# Altium footprint library 我的元件库01.PcbLib: 321 footprints (part 8 of 21)
Each footprint in its own frame and in the unit in brackets; x right, y up, seen from the top. Pads: shape width x height; smd on the part's side, far side on the other; paste and mask are expansions set on the pad; w line width, h text height; cw(c..) or ccw(c..) is an arc to the next point about the centre after c.
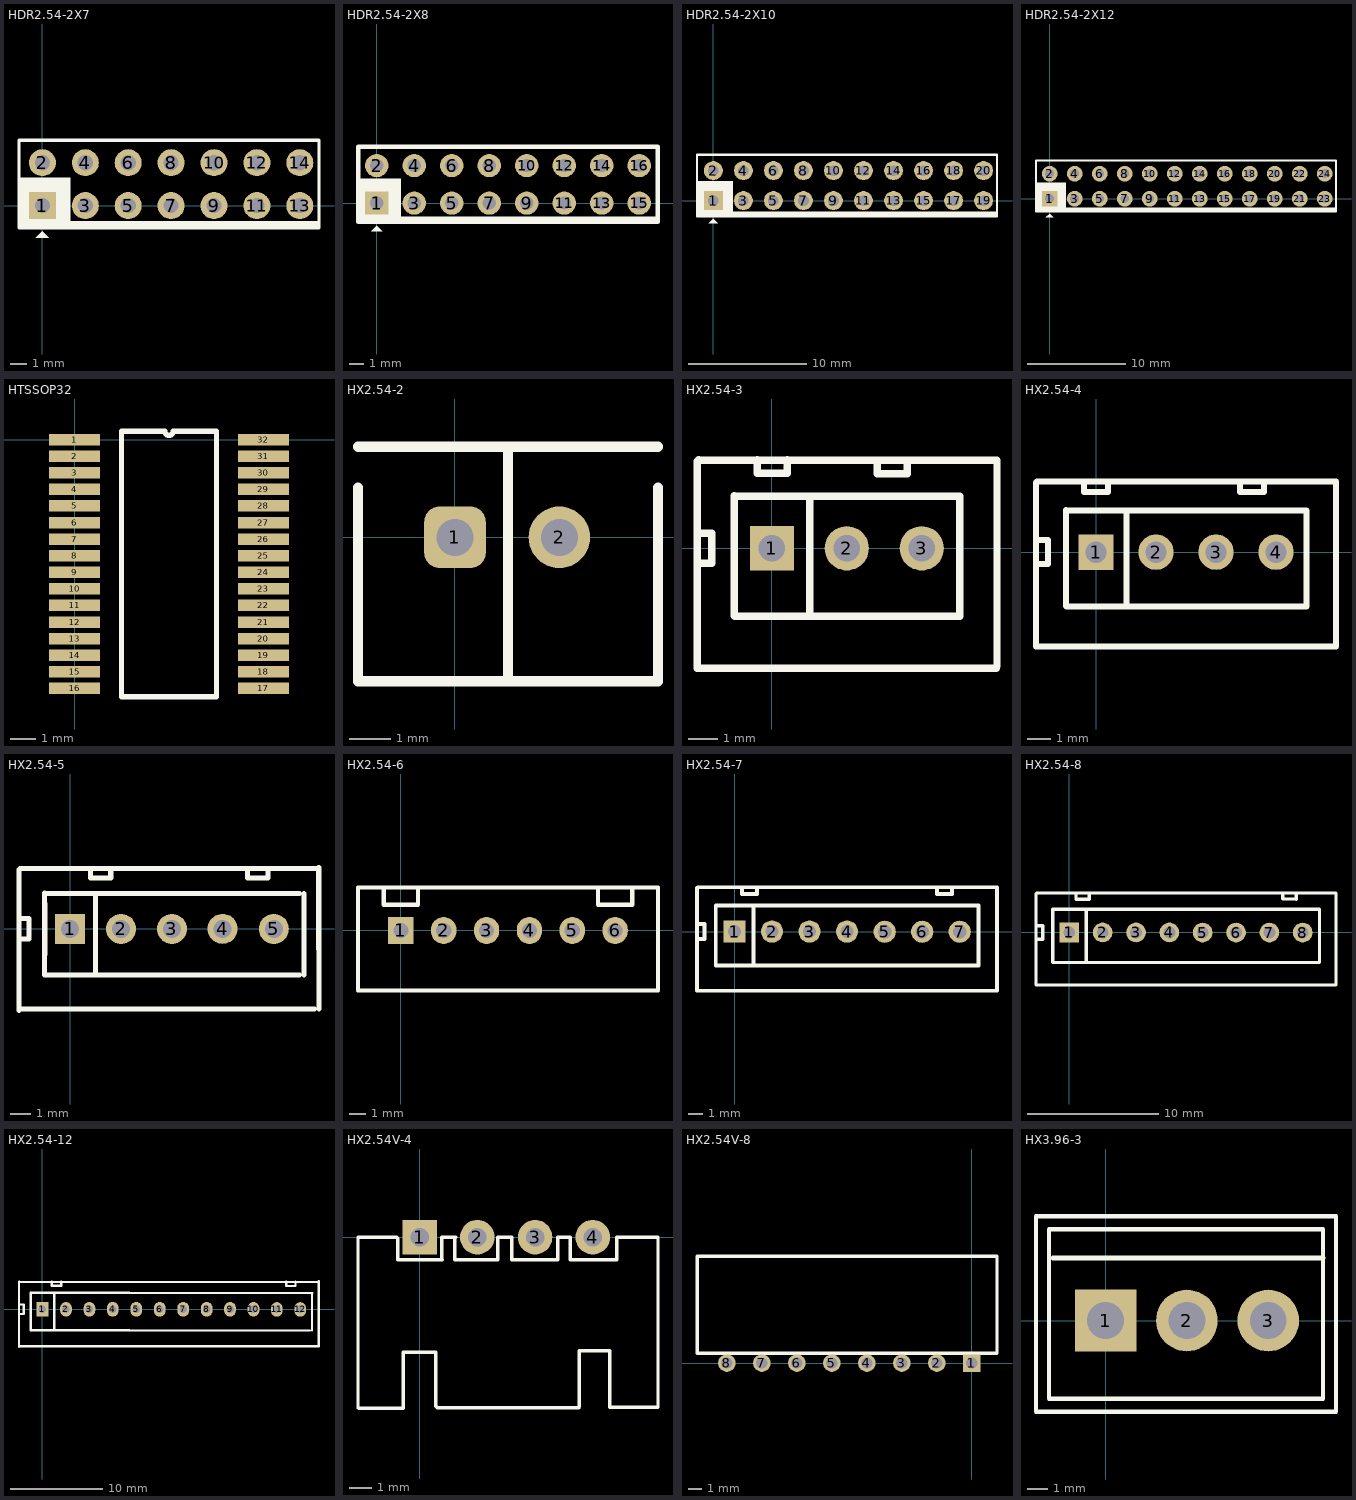
[diagram p7: the footprints below, top view; thin cyan lines are the x and y axes]

## HDR2.54-2X7 [mm]
pads (14):
  rect 1.6x1.6 hole 0.9: 1(0,0)
  round 1.6 hole 0.9: 2(0,2.54) 3(2.54,0) 4(2.54,2.54) 5(5.08,0) 6(5.08,2.54) 7(7.62,0) 8(7.62,2.54) 9(10.16,0) 10(10.16,2.54) 11(12.7,0) 12(12.7,2.54) 13(15.24,0) 14(15.24,2.54)
Top Overlay:
  rectangle: -1.387,-1.328 1.651,1.651
  region: -0.381,-1.905 0.381,-1.905 0,-1.524
  lines w0.2: -1.387,-1.143 16.377,-1.143 ; -1.26,-1.016 16.377,-1.016
  lines w0.203: -1.387,-1.328 16.377,-1.328 16.377,3.868 -1.387,3.868 -1.387,-1.328

## HDR2.54-2X8 [mil]
pads (16):
  rect 62x62 hole 35.43: 1(0,0)
  round 62 hole 35.43: 2(0,100) 3(100,0) 4(100,100) 5(200,0) 6(200,100) 7(300,0) 8(300,100) 9(400,0) 10(400,100) 11(500,0) 12(500,100) 13(600,0) 14(600,100) 15(700,0) 16(700,100)
Top Overlay:
  rectangle: -50,-50 65,65
  region: -15,-75 15,-75 0,-60
  lines w7.87: -50,-40 750,-40
  lines w12: -50,50 50,50 50,-50 ; -50,-50 750,-50 750,150 -50,150 -50,-50

## HDR2.54-2X10 [mm]
pads (20):
  rect 1.6x1.6 hole 0.9: 1(0,0)
  round 1.6 hole 0.9: 2(0,2.54) 3(2.54,0) 4(2.54,2.54) 5(5.08,0) 6(5.08,2.54) 7(7.62,0) 8(7.62,2.54) 9(10.16,0) 10(10.16,2.54) 11(12.7,0) 12(12.7,2.54) 13(15.24,0) 14(15.24,2.54) 15(17.78,0) 16(17.78,2.54) 17(20.32,0) 18(20.32,2.54) 19(22.86,0) 20(22.86,2.54)
Top Overlay:
  rectangle: -1.387,-1.328 1.651,1.651
  region: -0.381,-1.905 0.381,-1.905 0,-1.524
  lines w0.2: -1.26,-1.143 23.997,-1.143 ; -1.26,-1.016 23.997,-1.016
  lines w0.203: -1.387,-1.328 -1.387,3.868 23.997,3.868 23.997,-1.328 -1.387,-1.328

## HDR2.54-2X12 [mm]
pads (24):
  rect 1.6x1.6 hole 0.9: 1(0,0)
  round 1.6 hole 0.9: 2(0,2.54) 3(2.54,0) 4(2.54,2.54) 5(5.08,0) 6(5.08,2.54) 7(7.62,0) 8(7.62,2.54) 9(10.16,0) 10(10.16,2.54) 11(12.7,0) 12(12.7,2.54) 13(15.24,0) 14(15.24,2.54) 15(17.78,0) 16(17.78,2.54) 17(20.32,0) 18(20.32,2.54) 19(22.86,0) 20(22.86,2.54) 21(25.4,0) 22(25.4,2.54) 23(27.94,0) 24(27.94,2.54)
Top Overlay:
  rectangle: -1.387,-1.328 1.651,1.651
  region: -0.381,-1.905 0.381,-1.905 0,-1.524
  lines w0.2: -1.26,-1.143 29.077,-1.143 ; -1.26,-1.016 29.077,-1.016
  lines w0.203: -1.387,-1.328 -1.387,3.868 29.077,3.868 29.077,-1.328 -1.387,-1.328

## HTSSOP32 [mm]
pads (32):
  rect 2x0.45 smd: 1(0,0) 2(0,-0.65) 3(0,-1.3) 4(0,-1.95) 5(0,-2.6) 6(0,-3.25) 7(0,-3.9) 8(0,-4.55) 9(0,-5.2) 10(0,-5.85) 11(0,-6.5) 12(0,-7.15) 13(0,-7.8) 14(0,-8.45) 15(0,-9.1) 16(0,-9.75) 17(7.4,-9.75) 18(7.4,-9.1) 19(7.4,-8.45) 20(7.4,-7.8) 21(7.4,-7.15) 22(7.4,-6.5) 23(7.4,-5.85) 24(7.4,-5.2) 25(7.4,-4.55) 26(7.4,-3.9) 27(7.4,-3.25) 28(7.4,-2.6) 29(7.4,-1.95) 30(7.4,-1.3) 31(7.4,-0.65) 32(7.4,0)
Top Overlay:
  lines w0.2: 1.835,-10.075 1.835,0.325 3.538,0.325 ccw(c3.7,0.325) 3.862,0.325 5.565,0.325 5.565,-10.075 1.835,-10.075

## HX2.54-2 [mm] "两针白色插座（已加焊）"
pads (2):
  rrect50% 1.5x1.5 hole 0.9: 1(0,0)
  round 1.5 hole 0.9: 2(2.54,0)
Top Overlay:
  lines w0.254: -2.36,1.206 -2.36,-3.5 4.94,-3.5 4.94,1.206 ; -2.36,2.2 4.94,2.2 ; 1.29,-3.5 1.29,2.2
3D body "SIP2_Y.stp": height 7, standoff -3, extent -2.48,-3.55 5.02,2.45

## HX2.54-3 [mm]
pads (3):
  rect 1.5x1.5 hole 0.9: 1(0,0)
  round 1.5 hole 0.9: 2(2.54,0) 3(5.08,0)
Top Overlay:
  lines w0.254: -2.54,-0.508 -2.032,-0.508 -2.032,0.508 -2.54,0.508 ; -2.536,2.54 -2.536,2.95 ; -2.496,2.995 7.633,2.995 7.633,-4.005 ; -1.27,-2.286 -1.27,1.778 ; -1.257,-2.296 6.363,-2.296 ; -1.257,1.768 6.375,1.768 ; -0.504,2.998 -0.504,2.538 0.512,2.538 0.512,2.998 ; 1.283,-2.296 1.283,1.768 ; 3.573,2.995 3.573,2.535 4.589,2.535 4.589,2.995 ; 6.375,-2.299 6.375,1.765 ; 7.607,-4.061 -2.536,-4.061 -2.536,2.95 ; -2.536,2.95 -2.488,2.998 -2.536,2.95
3D body "hx254-3tl_y.stp": height 7, standoff -3, extent -2.409,-3.581 7.591,2.419

## HX2.54-4 [mm]
pads (4):
  rect 1.5x1.5 hole 0.9: 1(0,0)
  round 1.5 hole 0.9: 2(2.54,0) 3(5.08,0) 4(7.62,0)
Top Overlay:
  lines w0.254: -2.54,-0.508 -2.032,-0.508 -2.032,0.508 -2.54,0.508 ; -2.536,-4.002 -2.536,2.95 ; -2.472,-4.002 -2.092,-4.002 10.16,-4.002 10.16,2.998 -2.488,2.998 ; -1.27,-2.286 -1.27,1.778 ; -1.257,-2.296 8.903,-2.296 8.903,1.768 -1.257,1.768 ; -0.504,2.998 -0.504,2.538 0.512,2.538 0.512,2.998 ; 1.283,-2.296 1.283,1.768 ; 6.1,2.998 6.1,2.538 7.116,2.538 7.116,2.998 ; -2.536,2.95 -2.488,2.998 ; -2.536,2.95 -2.488,2.998
3D body "hx254-4tl_y.stp": height 7, standoff -3, extent -2.399,-3.562 10.121,2.438

## HX2.54-5 [mm]
pads (5):
  rect 1.5x1.5 hole 0.9: 1(0,0)
  round 1.5 hole 0.9: 2(2.54,0) 3(5.08,0) 4(7.607,0.006) 5(10.16,0)
Top Overlay:
  lines w0.254: -2.553,-0.502 -2.045,-0.502 -2.045,0.514 -2.553,0.514 ; -2.491,-3.996 12.179,-3.996 ; -2.104,-3.996 -2.484,-3.996 -2.548,-4.06 -2.548,-2.028 -2.548,2.956 -2.5,3.004 12.416,3.014 ; -1.283,-2.28 -1.283,1.784 ; -1.27,-2.29 11.43,-2.29 ; -1.27,-1.27 -1.27,1.27 ; -1.27,1.774 11.43,1.774 ; 1.008,3.004 1.008,2.544 2.024,2.544 2.024,3.004 ; 1.27,-2.29 1.27,1.774 ; 1.27,-1.27 1.27,1.27 ; 8.856,3.004 8.856,2.544 9.872,2.544 9.872,3.004 ; 11.659,-2.29 11.659,1.774 ; 12.403,-1.01 12.403,3.054 ; 12.408,-3.996 12.408,0.004
3D body "hx254-5tl_y.stp": height 7.51, standoff -2.49, extent -2.562,-3.562 12.518,2.438

## HX2.54-6 [mm]
pads (6):
  rect 1.5x1.6 hole 0.9: 1(0,0)
  oval 1.5x1.6 hole 0.9: 2(2.54,0) 3(5.08,0) 4(7.62,0) 5(10.16,0) 6(12.7,0)
Top Overlay:
  lines w0.254: -1.016,2.54 -1.016,1.524 1.016,1.524 1.016,2.54 ; 11.684,2.54 11.684,1.524 13.716,1.524 13.716,2.54 ; -2.54,-3.556 15.24,-3.556 15.24,2.54 -2.54,2.54 -2.54,-3.556

## HX2.54-7 [mm]
pads (7):
  rect 1.5x1.5 hole 0.9: 1(0,0)
  round 1.5 hole 0.9: 2(2.54,0) 3(5.08,0) 4(7.62,0) 5(10.173,-0.01) 6(12.713,-0.01) 7(15.253,-0.01)
Top Overlay:
  lines w0.254: -2.54,-0.508 -2.032,-0.508 -2.032,0.508 -2.54,0.508 ; -1.257,-2.296 16.523,-2.296 16.523,1.768 -1.257,1.768 ; 0.512,2.998 0.512,2.538 1.528,2.538 1.528,2.998 ; 1.283,-2.296 1.283,1.768 ; 9.398,-2.286 -1.27,-2.286 -1.27,1.778 9.398,1.778 ; 13.72,2.998 13.72,2.538 14.736,2.538 14.736,2.998 ; 17.776,-4.002 17.776,2.998 ; 17.78,-4.002 -2.536,-4.002 -2.536,2.95 -2.488,2.998 17.78,2.998

## HX2.54-8 [mm]
pads (8):
  rect 1.5x1.5 hole 0.9: 1(0,0)
  round 1.5 hole 0.9: 2(2.54,0) 3(5.08,0) 4(7.62,0) 5(10.16,-0.01) 6(12.7,-0.01) 7(15.24,-0.01) 8(17.78,-0.01)
Top Overlay:
  lines w0.254: -2.54,-0.508 -2.032,-0.508 -2.032,0.508 -2.54,0.508 ; 0.512,2.998 0.512,2.538 1.528,2.538 1.528,2.998 ; 1.283,-2.296 1.283,1.768 ; 16.256,3 16.256,2.54 17.272,2.54 ; 17.276,2.538 17.276,2.998 ; 19.063,-2.296 19.063,1.768 ; 19.063,-2.286 -1.27,-2.286 -1.27,1.778 19.063,1.778 ; -2.536,-4.002 -2.536,2.95 -2.488,2.998 20.316,2.998 20.316,-4.002 -2.536,-4.002

## HX2.54-12 [mil]
pads (12):
  rect 50x62 hole 32: 1(0,0)
  oval 50x62 hole 32: 2(100.5,0.5) 3(200.5,0.5) 4(300,0.73) 5(400.5,0.5) 6(500.5,0.5) 7(600.5,0.5) 8(700.5,0.5) 9(800.5,0.5) 10(900.5,0.5) 11(1000,0) 12(1100,0)
Top Overlay:
  lines w10: -100,-19.26 -80,-19.26 -80,20.74 -100,20.74 ; -97.94,118.76 -99.83,116.87 ; -97.57,-156.83 1180,-156.83 ; -82.35,-156.83 -97.31,-156.83 -99.83,-159.35 -99.83,-79.35 -99.83,116.87 ; -49.5,-89.66 1141,-89.66 ; -49.5,70.34 1150.5,70.34 ; 40.17,118.76 40.17,100.65 80.17,100.65 80.17,118.76 ; 50.5,-89.66 50.5,70.34 ; 370,-89.26 -50,-89.26 -50,70.74 370,70.74 ; 1039.67,118.26 1039.67,100.15 1079.67,100.15 1079.67,118.26 ; 1150,-90.16 1150,69.84 ; 1175.96,116.87 -99.83,116.87 ; 1179.33,-39.76 1179.33,120.24 ; 1179.5,-157.33 1179.5,0.15 ; -49.5,-49.5 -49.5,50.5 -49.5,-49.5 ; 50.5,-49.5 50.5,50.5 50.5,-49.5

## HX2.54V-4 [mil]
pads (4):
  rect 60x60 hole 32: 1(0,0)
  round 60 hole 32: 2(100,0) 3(200,0) 4(300,0)
Top Overlay:
  lines w6.06: 26.14,-199.13 -28.11,-199.13 -28.11,-296.38 -105.91,-296.38 -106.93,-295.35 -106.93,0 -40,0 -38.35,-1.65 -38.35,-38.66 -37.8,-39.21 39.21,-39.21 38.66,-38.66 38.66,0 ; 28.19,-199.13 28.19,-293.31 30.24,-295.35 275.91,-295.35 276.93,-294.33 276.93,-198.11 ; 40,0 62.2,0 ; 61.18,0 61.18,-39.45 134.65,-39.45 135.2,-38.9 135.2,0 ; 135.67,0 159.21,0 ; 159.76,-39.21 159.76,0 ; 160.55,-39.21 238.82,-39.21 239.06,-38.98 239.06,0 260.55,0 ; 261.1,0 261.1,-39.45 341.97,-39.45 ; 276.93,-197.09 329.13,-197.09 329.61,-197.56 329.61,-294.88 413.07,-294.88 413.07,0 343.54,0 ; 341.97,-38.43 341.97,0

## HX2.54V-8 [mil]
pads (8):
  rect 50x50 hole 32: 1(0,0)
  round 50 hole 32: 2(-100,0) 3(-200,0) 4(-300,0) 5(-400,0) 6(-500,0) 7(-600,0) 8(-700,0)
Top Overlay:
  lines w10: -785.25,305.32 72,305.65 72,30 ; -784.92,28.05 71.08,28.05 ; -784.84,28.05 -784.84,305.73 ; -782.92,28.05 -766.92,28.05

## HX3.96-3 [mm]
pads (3):
  rect 3x3 hole 1.8: 1(0,0)
  round 3 hole 1.8: 2(3.96,0) 3(7.92,0)
Top Overlay:
  lines w0.203: -3.387,-4.445 11.218,-4.445 11.218,5.08 -3.387,5.08 -3.387,-4.445 ; -2.752,-3.81 10.583,-3.81 10.583,4.445 -2.752,4.445 -2.752,-3.81
  lines w0.254: -2.547,3.048 10.583,3.048